# Altium footprint library Connector.PcbLib: 231 footprints (part 6 of 15)
Each footprint in its own frame and in the unit in brackets; x right, y up, seen from the top. Pads: shape width x height; smd on the part's side, far side on the other; paste and mask are expansions set on the pad; w line width, h text height; cw(c..) or ccw(c..) is an arc to the next point about the centre after c.
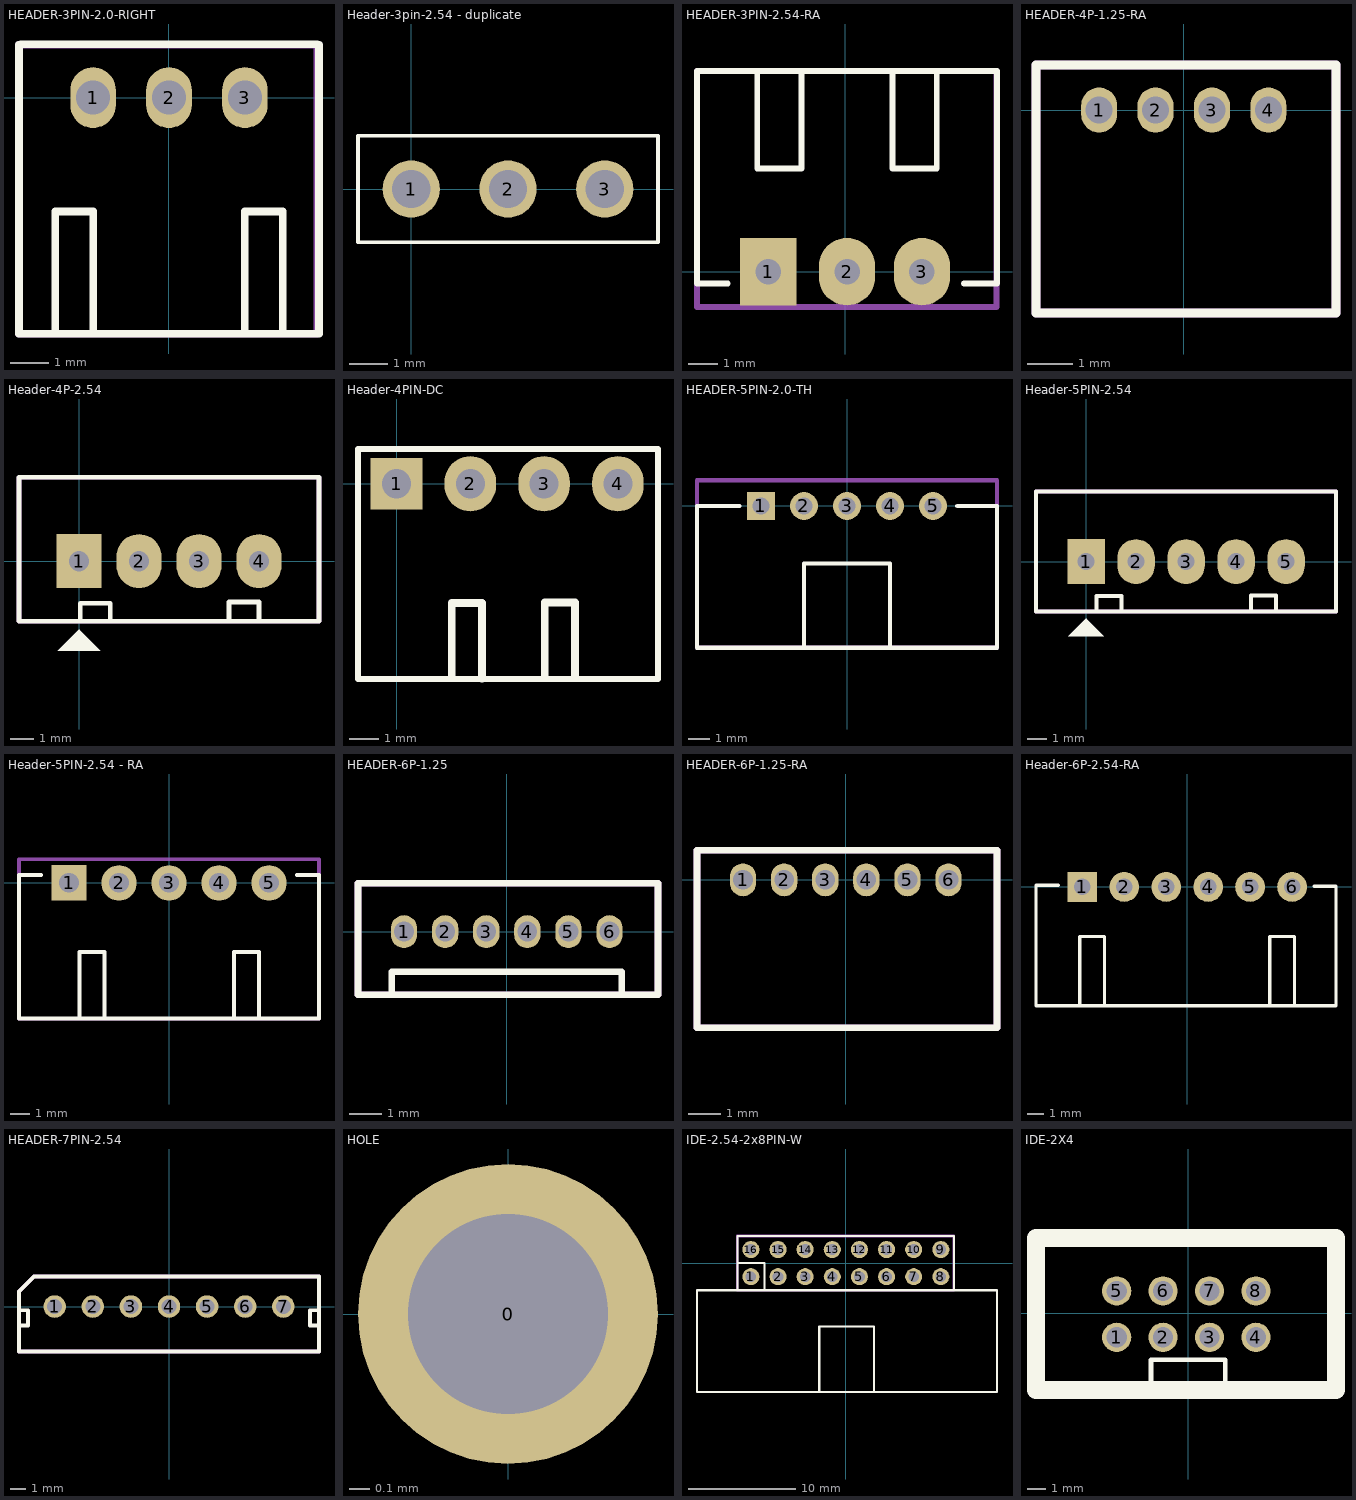
[diagram p5: the footprints below, top view; thin cyan lines are the x and y axes]

## HEADER-3PIN-2.0-RIGHT [mm]
pads (3):
  oval 1.2x1.6 hole 0.9: 1(-2,0) 2(0,0) 3(2,0)
Top Overlay:
  lines w0.2: -3.95,1.397 -3.95,-6.213 1.95,-6.213 ; -3.9,1.4 3.9,1.4 ; -3,-6.2 -3,-3 -2,-3 -2,-6.213 ; -1.95,-6.213 3.95,-6.213 3.95,1.397 ; 2,-6.213 2,-3 3,-3 3,-6.2
Mechanical 13:
  lines w0.2: -3.95,-6.213 -3.95,1.397 3.9,1.397 3.9,-6.213 -3.95,-6.213
  text ".Designator" at -0.2,0.8 h1.5
3D body "S3B-PH-K-S.STEP": height 4.9, standoff -3.3, extent -3.95,-6.2 3.95,1.4

## Header-3pin-2.54 - duplicate [mm]
pads (3):
  round 1.5 hole 1: 1(0,0) 2(2.54,0) 3(5.08,0)
Top Overlay:
  lines w0.1: -1.397,-1.397 -1.168,-1.397 6.477,-1.397 6.477,1.397 -1.016,1.397 -1.397,1.397 -1.397,-1.397
3D body "65779.stp": height 8.57, standoff -2.97, extent -1.27,-1.27 6.35,1.27

## HEADER-3PIN-2.54-RA [mil] "CON 3"
height 200
pads (3):
  rect 75x90 hole 34: 1(-102.5,0)
  oval 75x90 hole 34: 2(2.5,0) 3(102.5,0)
Top Overlay:
  lines w7.87: -156.56,-15.75 -197.5,-15.75 -197.5,267.72 202.5,267.72 202.5,-15.75 158.41,-15.75 ; -117.19,267.72 -117.19,137.8 -58.13,137.8 -58.13,267.72 ; 63.13,267.72 63.13,137.8 122.19,137.8 122.19,267.72
Mechanical 13:
  lines w7.87: -197.5,-47.24 -197.5,267.72 201.71,267.72 201.71,-47.24 -197.5,-47.24
  text ".Designator" at -122.05,86.61 h59.06
Mechanical 15:
  lines w7.87: -197.5,-47.24 201.71,-47.24 201.71,267.72 -197.5,267.72 -197.5,-47.24
  text ".Comment" at -122.05,86.61 h59.06
3D body "Header 3 pin.STEP": height 234.25, standoff -100.39, extent -197.5,-15.75 202.5,267.72

## HEADER-4P-1.25-RA [mm]
pads (4):
  oval 0.8x1 hole 0.6: 1(-1.875,0) 2(-0.625,0) 3(0.625,0) 4(1.875,0)
Top Overlay:
  lines w0.2: -3.275,-4.5 3.375,-4.5 3.375,1 -3.275,1 -3.275,-4.5
Mechanical 13:
  lines w0.2: -3.275,-4.5 -3.275,1 3.375,1 3.375,-4.5 -3.275,-4.5
  text ".Designator" at -3.275,-2 h1.5
Mechanical 15:
  lines w0.2: -3.275,-4.5 -3.275,1 3.375,1 3.375,-4.5 -3.275,-4.5
  text ".Comment" at -3.275,-2 h1.5
3D body "31731.stp": height 3.68, standoff -2.22, extent -3.325,-4.5 3.325,0.9

## Header-4P-2.54 [mil] "CON4"
height 200
pads (4):
  rect 75x90 hole 34: 1(0,0)
  oval 75x90 hole 34: 2(100,0) 3(200,0) 4(300,0)
Top Overlay:
  region: -35.5,-149.5 35.5,-149.5 0.5,-114.5 0.5,-113.5
  lines w7.87: 2,-100 2,-70 52,-70 52,-100 ; 250,-98 250,-68 300,-68 300,-98 ; -100,-100 -100,140 400,140 400,0 400,-100 -100,-100
Mechanical 13:
  lines w7.87: -100,-100 400,-100 400,140 -100,140 -100,-100
  text ".Designator" at 0,0 h59.06
Mechanical 15:
  lines w7.87: -100,-100 400,-100 400,140 -100,140 -100,-100
  text ".Comment" at 0,0 h59.06

## Header-4PIN-DC [mil]
pads (4):
  rect 70x70 hole 39.37: 1(0,0)
  oval 70x75 hole 39.37: 2(100,0) 3(200,0) 4(300,0)
Top Overlay:
  lines w7.87: -52.2,-264.76 -52.2,47.24 354.33,47.24 354.33,-264.76 -52.2,-264.76
  lines w10: 239.79,-160.76 cw(c239.79,-161.76) 240.79,-161.76
  lines w10.63: 74.79,-260.76 74.79,-161.76 115.79,-161.76 115.79,-263.76 ; 200.79,-262.76 200.79,-160.76 241.79,-160.76 241.79,-260.76

## HEADER-5PIN-2.0-TH [mm]
pads (5):
  rect 1.3x1.3 hole 0.8: 1(-4,0)
  round 1.3 hole 0.8: 2(-2,0) 3(0,0) 4(2,0) 5(4,0)
Top Overlay:
  lines w0.2: -5,0 -6.975,0 -6.975,-6.6 6.975,-6.6 6.975,0 5.125,0 ; -2,-6.6 -2,-2.675 2,-2.675 2,-6.6
Mechanical 13:
  lines w0.2: -6.975,-6.6 -6.975,1.2 6.975,1.2 6.975,-6.6 -6.975,-6.6
  text ".Designator" at -3.35,-3.275 h1.5
Mechanical 15:
  lines w0.2: -6.975,-6.6 -6.975,1.2 6.975,1.2 6.975,-6.6 -6.975,-6.6
  text ".Comment" at -3.35,-3.275 h1.5
3D body "B5B-PH-SM4-TB.STEP": height 5.03, standoff -1.97, extent -6.975,-6.6 6.975,0

## Header-5PIN-2.54 [mil] "CON5"
height 200
pads (5):
  rect 75x90 hole 34: 1(0,0)
  oval 75x90 hole 34: 2(100,0) 3(200,0) 4(300,0) 5(400,0)
Top Overlay:
  region: -35.5,-149.5 35.5,-149.5 0.5,-114.5 0.5,-113.5
  lines w7.87: 21,-99 21,-69 71,-69 71,-99 ; 330,-98 330,-68 380,-68 380,-98 ; -100,-100 -100,140 500,140 500,0 500,-100 -100,-100
Mechanical 13:
  lines w7.87: -100,-100 500,-100 500,140 -100,140 -100,-100
  text ".Designator" at 19.68,0 h59.06
Mechanical 15:
  lines w7.87: -100,-100 500,-100 500,140 -100,140 -100,-100
  text ".Comment" at 0,0 h59.06

## Header-5PIN-2.54 - RA [mm] "CON5"
height 5.08
pads (5):
  rect 1.8x1.8 hole 1: 1(-5.08,0)
  round 1.8 hole 1: 2(-2.54,0) 3(0,0) 4(2.54,0) 5(5.08,0)
Top Overlay:
  lines w0.2: -6.5,0.4 -7.62,0.4 -7.62,-6.896 7.62,-6.896 7.62,-4.356 7.62,0.4 6.5,0.4 ; -4.547,-6.871 -4.547,-3.5 -3.277,-3.5 -3.277,-6.871 ; 3.302,-6.845 3.302,-3.5 4.572,-3.5 4.572,-6.845
Mechanical 13:
  lines w0.2: -7.62,-6.9 7.62,-6.9 7.62,1.2 -7.62,1.2 -7.62,-6.9
  text ".Designator" at -3.6,-3.3 h1.5
Mechanical 15:
  text ".Comment" at -3.6,-3.3 h1.5
3D body "Header 5 pin.STEP": height 5.95, standoff -2.55, extent -7.62,-6.9 7.62,0.3

## HEADER-6P-1.25 [mm]
pads (6):
  oval 0.8x1 hole 0.6: 1(-3.125,0) 2(-1.875,0) 3(-0.625,0) 4(0.625,0) 5(1.875,0) 6(3.125,0)
Top Overlay:
  lines w0.2: -3.5,-1.925 -3.5,-1.225 3.5,-1.225 3.5,-1.925 ; -4.525,-1.925 4.6,-1.925 4.6,1.475 -4.525,1.475 -4.525,-1.925
Mechanical 13:
  lines w0.2: -4.525,-1.925 -4.525,1.475 4.6,1.475 4.6,-1.925 -4.525,-1.925
  text ".Designator" at -3.4,-0.625 h1.5
3D body "JST - GH - Thru (V) - 6Pin - 1.25mm.stp": height 4.22, standoff -2.26, extent -4.623,-1.93 4.624,1.397

## HEADER-6P-1.25-RA [mm]
pads (6):
  oval 0.8x1 hole 0.6: 1(-3.125,0) 2(-1.875,0) 3(-0.625,0) 4(0.625,0) 5(1.875,0) 6(3.125,0)
Top Overlay:
  lines w0.2: -4.525,-4.5 4.6,-4.5 4.6,0.9 -4.525,0.9 -4.525,-4.5
Mechanical 13:
  lines w0.2: -4.525,-4.5 -4.525,0.9 4.6,0.9 4.6,-4.5 -4.525,-4.5
  text ".Designator" at -3.1,-1.8 h1.5
Mechanical 15:
  lines w0.2: -4.525,-4.5 -4.525,0.9 4.6,0.9 4.6,-4.5 -4.525,-4.5
  text ".Comment" at -2.7,-2 h1.5
3D body "47580.stp": height 3.68, standoff -2.22, extent -4.575,-4.5 4.575,0.9

## Header-6P-2.54-RA [mm] "CON6"
height 5.08
pads (6):
  rect 1.8x1.8 hole 1: 1(-6.35,0)
  round 1.8 hole 1: 2(-3.81,0) 3(-1.27,0) 4(1.27,0) 5(3.81,0) 6(6.35,0)
Top Overlay:
  lines w0.2: -7.8,0.1 -9.15,0.1 -9.15,-7.189 9.011,-7.189 9.011,0.05 7.7,0.05 ; -6.5,-7.2 -6.5,-3 -5,-3 -5,-7.189 ; 5,-7.189 5,-3 6.5,-3 6.5,-7.2
3D body "Header X2.54 6P.stp": height 5.76, standoff 0.01, extent -9.15,-7.189 9.011,0.05

## HEADER-7PIN-2.54 [mm]
pads (7):
  round 1.5 hole 1: 1(-7.62,0) 2(-5.08,0) 3(-2.54,0) 4(0,0) 5(2.54,0) 6(5.08,0) 7(7.62,0)
Top Overlay:
  lines w0.254: -10,-1.27 -9.398,-1.27 -9.398,-0.254 -10,-0.254 ; 10,-1.27 9.398,-1.27 9.398,-0.254 10,-0.254 ; -10,-3 -10,1 -9,2 10,2 10,-3 -10,-3
Mechanical 13:
  lines w0.254: -10,-3 -10,1 -9,2 10,2 10,-3 -10,-3
Mechanical 15:
  lines w0.254: -10,-3 -10,1 -9,2 10,2 10,-3 -10,-3

## HOLE [mm]
pads (1):
  round 1.5 hole 1: 0(0,0)

## IDE-2.54-2x8PIN-W [mm]
pads (16):
  round 1.6 hole 1: 1(-8.89,-1.27) 2(-6.35,-1.27) 3(-3.81,-1.27) 4(-1.27,-1.27) 5(1.27,-1.27) 6(3.81,-1.27) 7(6.35,-1.27) 8(8.89,-1.27) 9(8.89,1.27) 10(6.35,1.27) 11(3.81,1.27) 12(1.27,1.27) 13(-1.27,1.27) 14(-3.81,1.27) 15(-6.35,1.27) 16(-8.89,1.27)
Top Overlay:
  lines w0.2: -10.16,0 -7.62,0 -7.62,-2.54 ; -2.489,-12.065 -2.489,-5.944 2.184,-5.944 2.633,-5.944 2.633,-12.065 ; -10.16,-2.54 -13.935,-2.54 -13.935,-5.235 -13.935,-12.065 0.025,-12.065 14.148,-12.065 14.148,-9.906 14.148,-2.54 10.11,-2.54 ; -10.16,-2.54 10.11,-2.54 ; -10.16,-2.54 -10.16,2.54 -5.08,2.54 10.11,2.54 10.11,-2.54
Mechanical 13:
  lines w0.254: -10.16,-2.54 10.11,-2.54 10.11,2.54 -10.16,2.54 -10.16,-2.54
  text ".Designator" at -7.01,-0.305 h1.5
Mechanical 15:
  lines w0.254: -10.16,-2.54 10.11,-2.54 10.11,2.54 -10.16,2.54 -10.16,-2.54
  text ".Comment" at -7.01,-0.305 h1.5
3D body "8x2w.step": height 9.11, standoff -2.9, extent -13.935,-12.065 13.985,1.595

## IDE-2X4 [mm]
pads (8):
  round 1.6 hole 1.1: 1(-3.906,-1.315) 2(-1.366,-1.315) 3(1.174,-1.315) 4(3.714,-1.315) 5(-3.906,1.225) 6(-1.366,1.225) 7(1.174,1.225) 8(3.714,1.225)
Top Overlay:
  lines w0.254: -2.032,-4.064 -2.032,-2.54 2.032,-2.54 2.032,-3.81
  lines w1: -8.326,3.955 -8.326,-4.2 2.992,-4.2 ; -8.326,4.118 2.992,4.118 ; -3.308,-4.2 8.1,-4.2 8.1,4.118 -3.308,4.118
Mechanical 13:
  text ".Designator" at -3.106,-0.35 h1.5
Mechanical 15:
  text ".Comment" at -3.106,-0.35 h1.5